# Altium footprint library cool_library.PcbLib: 1182 footprints (part 27 of 75)
Each footprint in its own frame and in the unit in brackets; x right, y up, seen from the top. Pads: shape width x height; smd on the part's side, far side on the other; paste and mask are expansions set on the pad; w line width, h text height; cw(c..) or ccw(c..) is an arc to the next point about the centre after c.
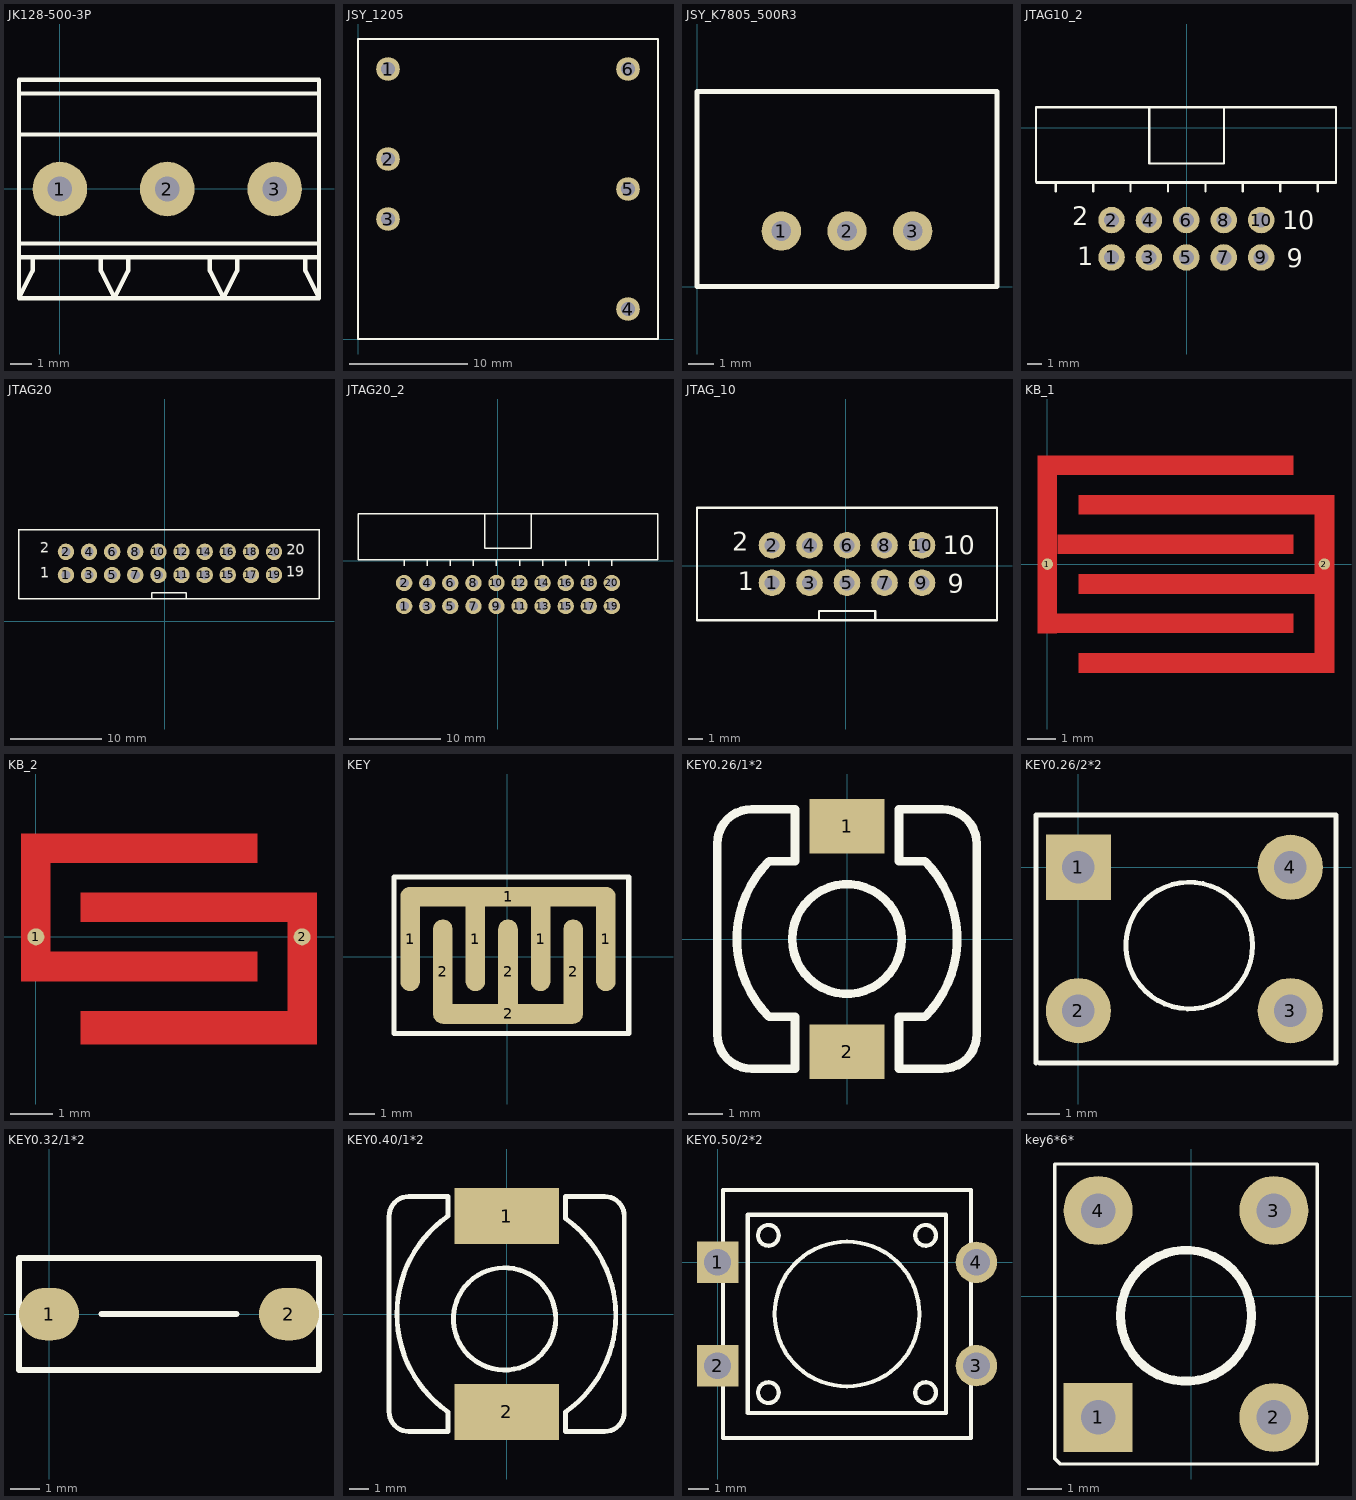
[diagram p26: the footprints below, top view; thin cyan lines are the x and y axes]

## JK128-500-3P [mil]
pads (3):
  round 100 hole 45: 1(0,-0.02) 2(196.85,-0.02) 3(393.7,-0.02)
Top Overlay:
  lines w8: -75,-125.02 225,-125.02 275,-125.02 275,-150.02 300,-200.02 325,-150.02 325,-125.02 ; -75,99.98 225,99.98 275,99.98 ; -75,174.98 225,174.98 275,174.98 ; -50,-125.02 -50,-150.02 -75,-200.02 ; 75,-125.02 75,-150.02 100,-200.02 125,-150.02 125,-125.02 425,-125.02 475,-125.02 ; 125,-200.02 425,-200.02 475,-200.02 ; 125,-100.02 425,-100.02 475,-100.02 ; 125,99.98 425,99.98 475,99.98 ; 125,174.98 425,174.98 475,174.98 ; 125,199.98 425,199.98 475,199.98 475,149.98 475,-150.02 475,-200.02 ; 275,-200.02 225,-200.02 -75,-200.02 ; 275,-100.02 225,-100.02 -75,-100.02 ; 275,199.98 225,199.98 -75,199.98 -75,-100.02 ; 450,-125.02 450,-150.02 475,-200.02 ; -75,-200.02 -75,-100.02

## JSY_1205 [mm]
pads (6):
  round 2 hole 1.2: 1(2.54,22.86) 2(2.54,15.24) 3(2.54,10.16) 4(22.86,2.54) 5(22.86,12.7) 6(22.86,22.86)
Top Overlay:
  lines w0.2: 0.635,0 0,0 ; 0,0 0,25.4 25.4,25.4 25.4,0 0,0

## JSY_K7805_500R3 [mil]
pads (3):
  round 60 hole 30: 1(128.35,84.65) 2(228.35,84.65) 3(328.35,84.65)
Top Overlay:
  lines w7.87: 0,0 0,297.24 456.69,297.24 456.69,0 0,0

## JTAG10_2 [mm]
pads (10):
  round 1.8 hole 1.016: 1(-5.09,-8.81) 2(-5.09,-6.27) 3(-2.55,-8.81) 4(-2.55,-6.27) 5(-0.01,-8.81) 6(-0.01,-6.27) 7(2.53,-8.81) 8(2.53,-6.27) 9(5.07,-8.81) 10(5.07,-6.27)
Top Overlay:
  lines w0.152: -10.17,-3.73 10.15,-3.73 ; -8.877,-4.329 -8.877,-3.694 ; -6.337,-4.329 -6.337,-3.694 ; -3.797,-4.329 -3.797,-3.694 ; -2.527,1.386 -2.527,-2.424 2.553,-2.424 2.553,1.386 ; -1.257,-4.329 -1.257,-3.694 ; 1.283,-4.329 1.283,-3.694 ; 3.823,-4.329 3.823,-3.694 ; 6.363,-4.329 6.363,-3.694 ; 8.903,-4.329 8.903,-3.694 ; -10.22,-3.694 10.15,-3.694 10.15,1.386 -10.22,1.386 -10.22,-3.694
  text "10" at 6.49,-6.88 h1.27
  text "9" at 6.81,-9.49 h1.27
  text "1" at -7.42,-9.33 h1.27
  text "2" at -7.77,-6.64 h1.27

## JTAG20 [mm]
pads (20):
  round 1.8 hole 1.016: 1(-10.877,5.106) 2(-10.877,7.646) 3(-8.337,5.106) 4(-8.337,7.646) 5(-5.797,5.106) 6(-5.797,7.646) 7(-3.257,5.106) 8(-3.257,7.646) 9(-0.717,5.106) 10(-0.717,7.646) 11(1.823,5.106) 12(1.823,7.646) 13(4.363,5.106) 14(4.363,7.646) 15(6.903,5.106) 16(6.903,7.646) 17(9.443,5.106) 18(9.443,7.646) 19(11.983,5.106) 20(11.983,7.646)
Top Overlay:
  lines w0.152: -16.03,10.12 -16.03,2.5 16.92,2.5 16.92,10.12 ; -16.017,10.096 16.9,10.096 ; -1.445,2.5 -1.445,3.135 2.365,3.135 2.365,2.5
  text "20" at 13.36,6.95 h2
  text "19" at 13.34,4.53 h2
  text "2" at -13.68,7.18 h2
  text "1" at -13.71,4.44 h2

## JTAG20_2 [mm]
pads (20):
  round 1.8 hole 1.016: 1(-10.327,-5.014) 2(-10.327,-2.474) 3(-7.787,-5.014) 4(-7.787,-2.474) 5(-5.247,-5.014) 6(-5.247,-2.474) 7(-2.707,-5.014) 8(-2.707,-2.474) 9(-0.167,-5.014) 10(-0.167,-2.474) 11(2.373,-5.014) 12(2.373,-2.474) 13(4.913,-5.014) 14(4.913,-2.474) 15(7.453,-5.014) 16(7.453,-2.474) 17(9.993,-5.014) 18(9.993,-2.474) 19(12.533,-5.014) 20(12.533,-2.474)
Top Overlay:
  lines w0.152: -10.327,-0.569 -10.327,0.066 ; -7.787,-0.569 -7.787,0.066 ; -5.247,-0.569 -5.247,0.066 ; -2.707,-0.569 -2.707,0.066 ; -1.437,5.146 -1.437,1.336 3.643,1.336 3.643,5.146 ; -0.167,-0.569 -0.167,0.066 ; 2.373,-0.569 2.373,0.066 ; 4.913,-0.569 4.913,0.066 ; 7.453,-0.569 7.453,0.066 ; 9.993,-0.569 9.993,0.066 ; 12.533,-0.569 12.533,0.066 ; -15.407,0.066 -15.407,5.146 17.613,5.146 17.613,0.066 -15.407,0.066

## JTAG_10 [mm]
pads (10):
  round 1.8 hole 1.016: 1(-4.99,-1.16) 2(-4.99,1.38) 3(-2.45,-1.16) 4(-2.45,1.38) 5(0.09,-1.16) 6(0.09,1.38) 7(2.63,-1.16) 8(2.63,1.38) 9(5.17,-1.16) 10(5.17,1.38)
Top Overlay:
  lines w0.152: -1.815,-3.7 -1.815,-3.065 1.995,-3.065 1.995,-3.7 ; -10.07,-3.7 -10.07,3.92 10.25,3.92 10.25,-3.7 -10.07,-3.7
  text "2" at -7.67,1.01 h1.27
  text "1" at -7.32,-1.68 h1.27
  text "9" at 6.91,-1.84 h1.27
  text "10" at 6.59,0.77 h1.27

## KB_1 [mm]
pads (2):
  round 0.4 all layers, no hole: 1(0,0) 2(9.798,0.003)
Top Layer:
  rectangle: -0.34,-2.45 0.35,3.85
  rectangle: -0.34,3.16 8.7,3.85
  rectangle: 0.36,0.35 8.7,1.05
  rectangle: 0.33,-2.44 8.7,-1.74
  rectangle: 1.11,1.76 9.75,2.45
  rectangle: 1.11,-1.05 9.75,-0.35
  rectangle: 1.11,-3.85 10.16,-3.15
  rectangle: 9.45,-3.55 10.15,2.45
Top Solder:
  rectangle: -0.4,-3.9 10.21,3.91

## KB_2 [mm]
pads (2):
  round 0.4 all layers, no hole: 1(0,0) 2(6.3,0)
Top Layer:
  rectangle: -0.35,1.75 5.25,2.45
  rectangle: -0.35,-0.38 0.35,2.45
  rectangle: -0.35,-1.05 5.25,-0.35
  rectangle: 1.05,0.35 6.65,1.05
  rectangle: 5.95,-1.86 6.65,1.05
  rectangle: 1.05,-2.55 6.65,-1.75
Top Solder:
  rectangle: -0.4,-2.6 6.7,2.5

## KEY [mil]
pads (9):
  oval 30x160 smd: 1(-148.82,27.56) 1(-48.82,27.56) 1(51.18,27.56) 1(151.18,27.56) 2(-98.82,-22.44) 2(1.18,-22.44) 2(101.18,-22.44)
  oval 330x30 smd: 1(1.18,92.56)
  oval 230x30 smd: 2(1.18,-87.44)
Top Overlay:
  lines w8: -173.82,-117.44 186.18,-117.44 186.18,122.56 -173.82,122.56 -173.82,-117.44

## KEY0.26/1*2 [mm]
pads (2):
  rect 2.2x1.6 smd: 1(0,3.302) 2(0,-3.302)
Top Overlay:
  circle w0.254: c0,0 r1.606
  lines w0.254: -3.81,-2.794 ccw(c-2.794,-2.794) -2.794,-3.81 -1.524,-3.81 -1.524,-2.286 -2.286,-2.286 cw(c0,0) -2.286,2.286 -1.524,2.286 -1.524,3.81 -2.794,3.81 ccw(c-2.794,2.794) -3.81,2.794 -3.81,-2.794 ; 1.524,-3.81 1.524,-2.286 2.286,-2.286 ccw(c0,0) 2.286,2.286 1.524,2.286 1.524,3.81 2.794,3.81 cw(c2.794,2.794) 3.81,2.794 3.81,-2.794 cw(c2.794,-2.794) 2.794,-3.81 1.524,-3.81

## KEY0.26/2*2 [mm]
pads (4):
  rect 2x2 hole 1: 1(0,0)
  round 2 hole 1: 2(0,-4.4) 3(6.5,-4.4) 4(6.5,0)
Top Overlay:
  circle w0.15: c3.4,-2.4 r1.942
  lines w0.15: -1.3,-6 -1.3,1.6 7.9,1.6 7.9,-6 -1.2,-6

## KEY0.32/1*2 [mil]
pads (2):
  oval 80x70 smd: 1(0,0) 2(320,0)
Top Overlay:
  lines w8: -40,-75 -40,75 360,75 360,-75 -40,-75 ; 70,0 250,0 160,0 70,0

## KEY0.40/1*2 [mm]
pads (2):
  rect 5.4x2.9 smd: 1(0,5.08) 2(0,-5.08)
Top Overlay:
  circle w0.254: c-0.112,-0.254 r2.652
  lines w0.254: -6.096,-5.08 ccw(c-5.08,-5.08) -5.08,-6.096 -3.048,-6.096 -3.048,-5.08 cw(c0.508,0) -3.048,5.08 -3.048,6.096 -5.08,6.096 ccw(c-5.08,5.08) -6.096,5.08 -6.096,-5.08 ; 3.048,-6.096 5.08,-6.096 ccw(c5.08,-5.08) 6.096,-5.08 6.096,5.08 ccw(c5.08,5.08) 5.08,6.096 3.048,6.096 3.048,4.943 cw(c-0.46,-0.069) 3.048,-5.08 3.048,-6.096

## KEY0.50/2*2 [mm]
pads (4):
  rect 2x2 hole 1.3: 1(0,0) 2(0,-5)
  round 2 hole 1.3: 3(12.5,-5) 4(12.5,0)
Top Overlay:
  circle w0.2: c2.45,1.3 r0.5
  circle w0.2: c2.45,-6.3 r0.5
  circle w0.2: c10.05,1.3 r0.5
  circle w0.2: c6.25,-2.5 r3.5
  circle w0.2: c10.05,-6.3 r0.5
  lines w0.203: 0.25,-8.5 0.25,3.5 12.25,3.5 12.25,-8.5 0.25,-8.5 ; 1.455,-7.281 1.455,2.295 11.031,2.295 11.031,-7.281 1.455,-7.281

## key6*6* [mm]
pads (4):
  rect 2x2 hole 1: 1(-2.702,-3.515)
  round 2 hole 1: 2(2.398,-3.515) 3(2.398,2.485) 4(-2.702,2.485)
Top Overlay:
  circle w0.254: c-0.152,-0.565 r1.9
  lines w0.1: -3.952,-4.715 -3.802,-4.865 -3.352,-4.865 -2.552,-4.865 -0.252,-4.865 2.698,-4.865 3.648,-4.865 3.648,3.835 -3.952,3.835 -3.952,-4.715